# Altium integrated library WE_WR-MPC4_Mini Power Connector_4.20 mm_rev15b.IntLib: 79 symbols (continued)
## WE-4.20 mm Male Dual Row Vertical Header 64902421122 (continued)
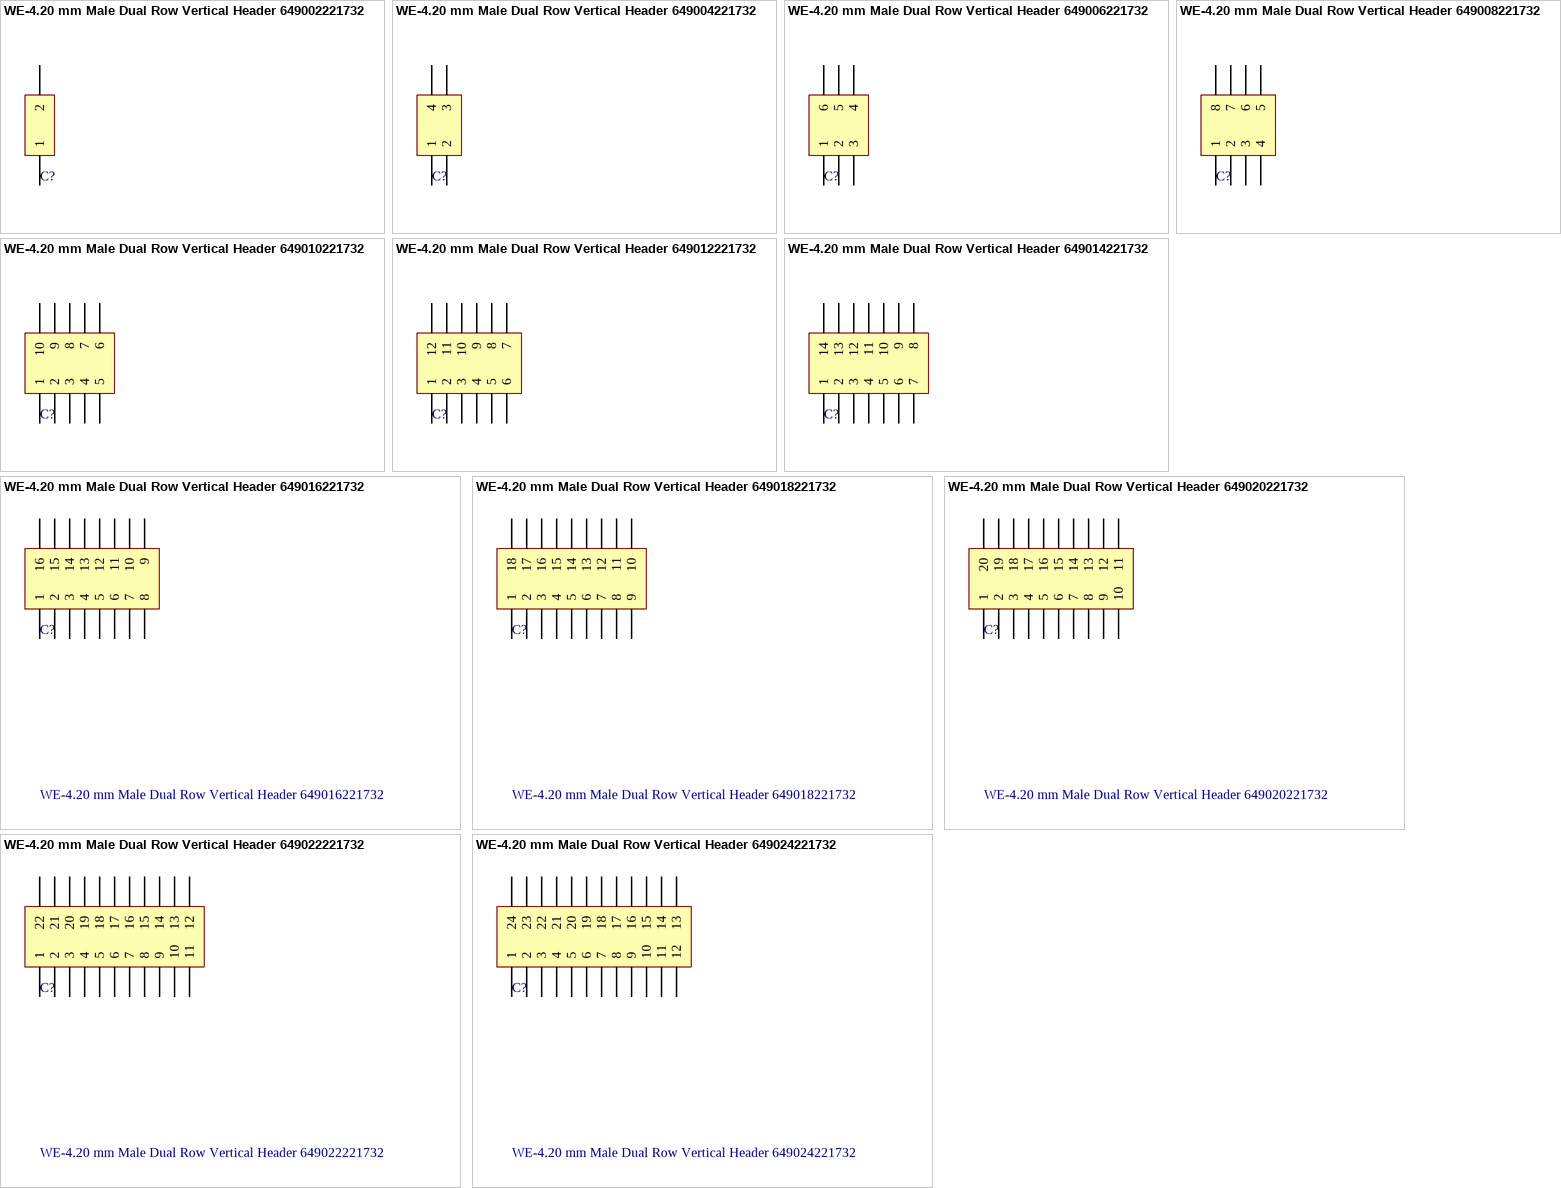
[diagram p3: symbols WE-4.20 mm Male Dual Row Vertical Header 649002221732 to WE-4.20 mm Male Dual Row Vertical Header 649024221732]

## WE-4.20 mm Male Dual Row Vertical Header 649002221732
designator C?
WR-MPC4 Mini power connector; Manufacturer: Würth Elektronik eiSos GmbH; ComponentLink1 Description: Manufacturer; ComponentLink2 Description: Datasheet; NoPins: 2; Created Date: 24 June 2013; partNo: 649002221732; ComponentLink1URL: http://www.we-online.com; ComponentLink2URL: http://katalog.we-online.de/em/datasheet/6490xx221732.pdf; Created by: Karrer Zheng
footprint 649002221732 (Dual row Vertical header With mounting pegs 02p)
pins: 1, 2

## WE-4.20 mm Male Dual Row Vertical Header 649004221732
designator C?
WR-MPC4 Mini power connector; Manufacturer: Würth Elektronik eiSos GmbH; ComponentLink1 Description: Manufacturer; ComponentLink2 Description: Datasheet; NoPins: 4; Created Date: 24 June 2013; partNo: 649004221732; ComponentLink1URL: http://www.we-online.com; ComponentLink2URL: http://katalog.we-online.de/em/datasheet/6490xx221732.pdf; Created by: Karrer Zheng
footprint 649004221732 (Dual row Vertical header With mounting pegs 04p)
pins: 1, 2, 3, 4

## WE-4.20 mm Male Dual Row Vertical Header 649006221732
designator C?
WR-MPC4 Mini power connector; Manufacturer: Würth Elektronik eiSos GmbH; ComponentLink1 Description: Manufacturer; ComponentLink2 Description: Datasheet; NoPins: 6; Created Date: 24 June 2013; partNo: 649006221732; ComponentLink1URL: http://www.we-online.com; ComponentLink2URL: http://katalog.we-online.de/em/datasheet/6490xx221732.pdf; Created by: Karrer Zheng
footprint 649006221732 (Dual row Vertical header With mounting pegs 06p)
pins: 1, 2, 3, 4, 5, 6

## WE-4.20 mm Male Dual Row Vertical Header 649008221732
designator C?
WR-MPC4 Mini power connector; Manufacturer: Würth Elektronik eiSos GmbH; ComponentLink1 Description: Manufacturer; ComponentLink2 Description: Datasheet; NoPins: 08; Created Date: 24 June 2013; partNo: 649008221732; ComponentLink1URL: http://www.we-online.com; ComponentLink2URL: http://katalog.we-online.de/em/datasheet/6490xx221732.pdf; Created by: Karrer Zheng
footprint 649008221732 (Dual row Vertical header With mounting pegs 08p)
pins: 1, 2, 3, 4, 5, 6, 7, 8

## WE-4.20 mm Male Dual Row Vertical Header 649010221732
designator C?
WR-MPC4 Mini power connector; Manufacturer: Würth Elektronik eiSos GmbH; ComponentLink1 Description: Manufacturer; ComponentLink2 Description: Datasheet; NoPins: 10; Created Date: 24 June 2013; partNo: 649010221732; ComponentLink1URL: http://www.we-online.com; ComponentLink2URL: http://katalog.we-online.de/em/datasheet/6490xx221732.pdf; Created by: Karrer Zheng
footprint 649010221732 (Dual row Vertical header With mounting pegs 10p)
pins: 1, 2, 3, 4, 5, 6, 7, 8, 9, 10

## WE-4.20 mm Male Dual Row Vertical Header 649012221732
designator C?
WR-MPC4 Mini power connector; Manufacturer: Würth Elektronik eiSos GmbH; ComponentLink1 Description: Manufacturer; ComponentLink2 Description: Datasheet; NoPins: 12; Created Date: 24 June 2013; partNo: 649012221732; ComponentLink1URL: http://www.we-online.com; ComponentLink2URL: http://katalog.we-online.de/em/datasheet/6490xx221732.pdf; Created by: Karrer Zheng
footprint 649012221732 (Dual row Vertical header With mounting pegs 12p)
pins: 1, 2, 3, 4, 5, 6, 7, 8, 9, 10, 11, 12

## WE-4.20 mm Male Dual Row Vertical Header 649014221732
designator C?
WR-MPC4 Mini power connector; Manufacturer: Würth Elektronik eiSos GmbH; ComponentLink1 Description: Manufacturer; ComponentLink2 Description: Datasheet; NoPins: 14; Created Date: 24 June 2013; partNo: 649014221732; ComponentLink1URL: http://www.we-online.com; ComponentLink2URL: http://katalog.we-online.de/em/datasheet/6490xx221732.pdf; Created by: Karrer Zheng
footprint 649014221732 (Dual row Vertical header With mounting pegs 14p)
pins: 1, 2, 3, 4, 5, 6, 7, 8, 9, 10, 11, 12, 13, 14

## WE-4.20 mm Male Dual Row Vertical Header 649016221732
designator C?
WR-MPC4 Mini power connector; Manufacturer: Würth Elektronik eiSos GmbH; ComponentLink1 Description: Manufacturer; ComponentLink2 Description: Datasheet; NoPins: 16; Created Date: 24 June 2013; partNo: 649016221732; ComponentLink1URL: http://www.we-online.com; ComponentLink2URL: http://katalog.we-online.de/em/datasheet/6490xx221732.pdf; Created by: Karrer Zheng
footprint 649016221732 (Dual row Vertical header With mounting pegs 16p)
pins: 1, 2, 3, 4, 5, 6, 7, 8, 9, 10, 11, 12, 13, 14, 15, 16

## WE-4.20 mm Male Dual Row Vertical Header 649018221732
designator C?
WR-MPC4 Mini power connector; Manufacturer: Würth Elektronik eiSos GmbH; ComponentLink1 Description: Manufacturer; ComponentLink2 Description: Datasheet; NoPins: 18; Created Date: 24 June 2013; partNo: 649018221732; ComponentLink1URL: http://www.we-online.com; ComponentLink2URL: http://katalog.we-online.de/em/datasheet/6490xx221732.pdf; Created by: Karrer Zheng
footprint 649018221732 (Dual row Vertical header With mounting pegs 18p)
pins: 1, 2, 3, 4, 5, 6, 7, 8, 9, 10, 11, 12, 13, 14, 15, 16, 17, 18

## WE-4.20 mm Male Dual Row Vertical Header 649020221732
designator C?
WR-MPC4 Mini power connector; Manufacturer: Würth Elektronik eiSos GmbH; ComponentLink1 Description: Manufacturer; ComponentLink2 Description: Datasheet; NoPins: 20; Created Date: 24 June 2013; partNo: 649020221732; ComponentLink1URL: http://www.we-online.com; ComponentLink2URL: http://katalog.we-online.de/em/datasheet/6490xx221732.pdf; Created by: Karrer Zheng
footprint 649020221732 (Dual row Vertical header With mounting pegs 20p)
pins: 1, 2, 3, 4, 5, 6, 7, 8, 9, 10, 11, 12, 13, 14, 15, 16, 17, 18, 19, 20

## WE-4.20 mm Male Dual Row Vertical Header 649022221732
designator C?
WR-MPC4 Mini power connector; Manufacturer: Würth Elektronik eiSos GmbH; ComponentLink1 Description: Manufacturer; ComponentLink2 Description: Datasheet; NoPins: 22; Created Date: 24 June 2013; partNo: 649022221732; ComponentLink1URL: http://www.we-online.com; ComponentLink2URL: http://katalog.we-online.de/em/datasheet/6490xx221732.pdf; Created by: Karrer Zheng
footprint 649022221732 (Dual row Vertical header With mounting pegs 22p)
pins: 1, 2, 3, 4, 5, 6, 7, 8, 9, 10, 11, 12, 13, 14, 15, 16, 17, 18, 19, 20, 21, 22

## WE-4.20 mm Male Dual Row Vertical Header 649024221732
designator C?
WR-MPC4 Mini power connector; Manufacturer: Würth Elektronik eiSos GmbH; ComponentLink1 Description: Manufacturer; ComponentLink2 Description: Datasheet; NoPins: 24; Created Date: 24 June 2013; partNo: 649024221732; ComponentLink1URL: http://www.we-online.com; ComponentLink2URL: http://katalog.we-online.de/em/datasheet/6490xx221732.pdf; Created by: Karrer Zheng
footprint 649024221732 (Dual row Vertical header With mounting pegs 24p)
pins: 1, 2, 3, 4, 5, 6, 7, 8, 9, 10, 11, 12, 13, 14, 15, 16, 17, 18, 19, 20, 21, 22, 23, 24


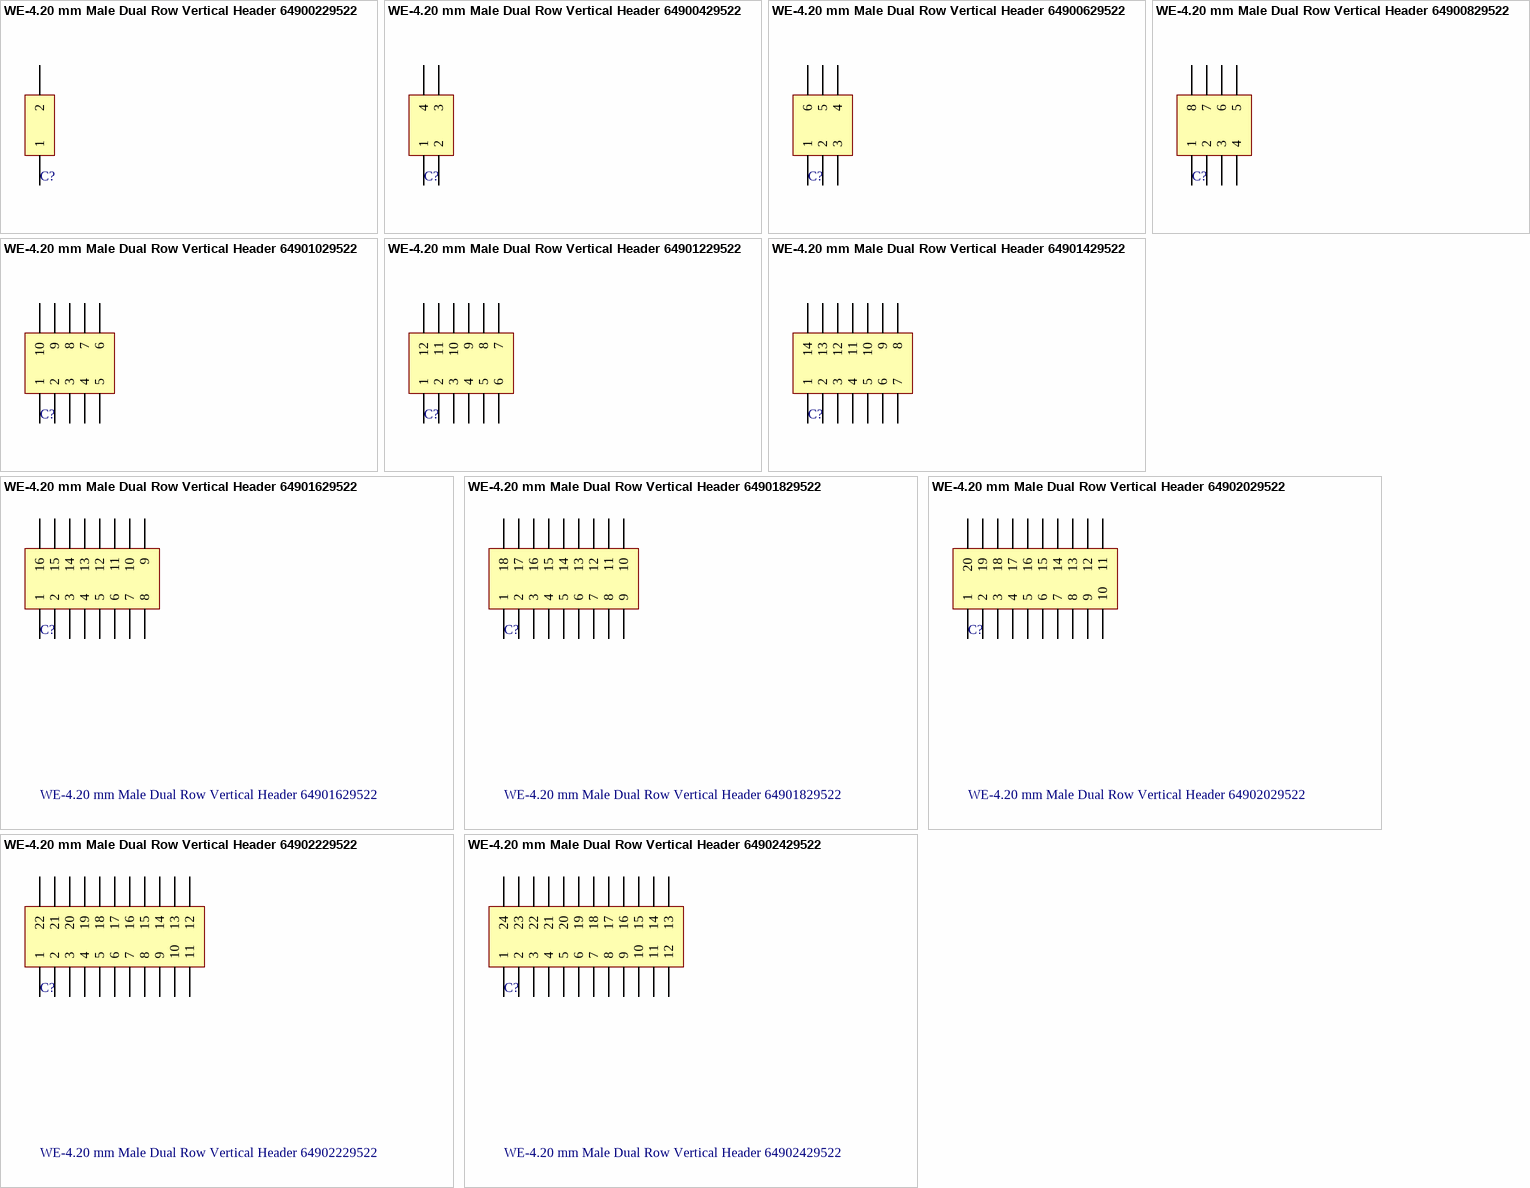
[diagram p4: symbols WE-4.20 mm Male Dual Row Vertical Header 64900229522 to WE-4.20 mm Male Dual Row Vertical Header 64902429522]

## WE-4.20 mm Male Dual Row Vertical Header 64900229522
designator C?
WR-MPC4 Mini power connector; Manufacturer: Würth Elektronik eiSos GmbH; ComponentLink1 Description: Manufacturer; ComponentLink2 Description: Datasheet; NoPins: 2; Created Date: 3 July 2013; partNo: 64900229522; ComponentLink1URL: http://www.we-online.com; ComponentLink2URL: http://katalog.we-online.de/em/datasheet/6490xx29522.pdf; Created by: Karrer Zheng
footprint 64900229522 (Dual row Right angle header 02p)
pins: 1, 2

## WE-4.20 mm Male Dual Row Vertical Header 64900429522
designator C?
WR-MPC4 Mini power connector; Manufacturer: Würth Elektronik eiSos GmbH; ComponentLink1 Description: Manufacturer; ComponentLink2 Description: Datasheet; NoPins: 4; Created Date: 3 July 2013; partNo: 64900429522; ComponentLink1URL: http://www.we-online.com; ComponentLink2URL: http://katalog.we-online.de/em/datasheet/6490xx29522.pdf; Created by: Karrer Zheng
footprint 64900429522 (Dual row Right angle header 04p)
pins: 1, 2, 3, 4

## WE-4.20 mm Male Dual Row Vertical Header 64900629522
designator C?
WR-MPC4 Mini power connector; Manufacturer: Würth Elektronik eiSos GmbH; ComponentLink1 Description: Manufacturer; ComponentLink2 Description: Datasheet; NoPins: 6; Created Date: 3 July 2013; partNo: 64900629522; ComponentLink1URL: http://www.we-online.com; ComponentLink2URL: http://katalog.we-online.de/em/datasheet/6490xx29522.pdf; Created by: Karrer Zheng
footprint 64900629522 (Dual row Right angle header 06p)
pins: 1, 2, 3, 4, 5, 6

## WE-4.20 mm Male Dual Row Vertical Header 64900829522
designator C?
WR-MPC4 Mini power connector; Manufacturer: Würth Elektronik eiSos GmbH; ComponentLink1 Description: Manufacturer; ComponentLink2 Description: Datasheet; NoPins: 8; Created Date: 3 July 2013; partNo: 64900829522; ComponentLink1URL: http://www.we-online.com; ComponentLink2URL: http://katalog.we-online.de/em/datasheet/6490xx29522.pdf; Created by: Karrer Zheng
footprint 64900829522 (Dual row Right angle header 08p)
pins: 1, 2, 3, 4, 5, 6, 7, 8

## WE-4.20 mm Male Dual Row Vertical Header 64901029522
designator C?
WR-MPC4 Mini power connector; Manufacturer: Würth Elektronik eiSos GmbH; ComponentLink1 Description: Manufacturer; ComponentLink2 Description: Datasheet; NoPins: 10; Created Date: 3 July 2013; partNo: 64901029522; ComponentLink1URL: http://www.we-online.com; ComponentLink2URL: http://katalog.we-online.de/em/datasheet/6490xx29522.pdf; Created by: Karrer Zheng
footprint 64901029522 (Dual row Right angle header 10p)
pins: 1, 2, 3, 4, 5, 6, 7, 8, 9, 10

## WE-4.20 mm Male Dual Row Vertical Header 64901229522
designator C?
WR-MPC4 Mini power connector; Manufacturer: Würth Elektronik eiSos GmbH; ComponentLink1 Description: Manufacturer; ComponentLink2 Description: Datasheet; NoPins: 12; Created Date: 3 July 2013; partNo: 64901229522; ComponentLink1URL: http://www.we-online.com; ComponentLink2URL: http://katalog.we-online.de/em/datasheet/6490xx29522.pdf; Created by: Karrer Zheng
footprint 64901229522 (Dual row Right angle header 12p)
pins: 1, 2, 3, 4, 5, 6, 7, 8, 9, 10, 11, 12

## WE-4.20 mm Male Dual Row Vertical Header 64901429522
designator C?
WR-MPC4 Mini power connector; Manufacturer: Würth Elektronik eiSos GmbH; ComponentLink1 Description: Manufacturer; ComponentLink2 Description: Datasheet; NoPins: 14; Created Date: 3 July 2013; partNo: 64901429522; ComponentLink1URL: http://www.we-online.com; ComponentLink2URL: http://katalog.we-online.de/em/datasheet/6490xx29522.pdf; Created by: Karrer Zheng
footprint 64901429522 (Dual row Right angle header 14p)
pins: 1, 2, 3, 4, 5, 6, 7, 8, 9, 10, 11, 12, 13, 14

## WE-4.20 mm Male Dual Row Vertical Header 64901629522
designator C?
WR-MPC4 Mini power connector; Manufacturer: Würth Elektronik eiSos GmbH; ComponentLink1 Description: Manufacturer; ComponentLink2 Description: Datasheet; NoPins: 16; Created Date: 3 July 2013; partNo: 64901629522; ComponentLink1URL: http://www.we-online.com; ComponentLink2URL: http://katalog.we-online.de/em/datasheet/6490xx29522.pdf; Created by: Karrer Zheng
footprint 64901629522 (Dual row Right angle header 16p)
pins: 1, 2, 3, 4, 5, 6, 7, 8, 9, 10, 11, 12, 13, 14, 15, 16

## WE-4.20 mm Male Dual Row Vertical Header 64901829522
designator C?
WR-MPC4 Mini power connector; Manufacturer: Würth Elektronik eiSos GmbH; ComponentLink1 Description: Manufacturer; ComponentLink2 Description: Datasheet; NoPins: 18; Created Date: 3 July 2013; partNo: 64901829522; ComponentLink1URL: http://www.we-online.com; ComponentLink2URL: http://katalog.we-online.de/em/datasheet/6490xx29522.pdf; Created by: Karrer Zheng
footprint 64901829522 (Dual row Right angle header 18p)
pins: 1, 2, 3, 4, 5, 6, 7, 8, 9, 10, 11, 12, 13, 14, 15, 16, 17, 18

## WE-4.20 mm Male Dual Row Vertical Header 64902029522
designator C?
WR-MPC4 Mini power connector; Manufacturer: Würth Elektronik eiSos GmbH; ComponentLink1 Description: Manufacturer; ComponentLink2 Description: Datasheet; NoPins: 20; Created Date: 3 July 2013; partNo: 64902029522; ComponentLink1URL: http://www.we-online.com; ComponentLink2URL: http://katalog.we-online.de/em/datasheet/6490xx29522.pdf; Created by: Karrer Zheng
footprint 64902029522 (Dual row Right angle header 20p)
pins: 1, 2, 3, 4, 5, 6, 7, 8, 9, 10, 11, 12, 13, 14, 15, 16, 17, 18, 19, 20

## WE-4.20 mm Male Dual Row Vertical Header 64902229522
designator C?
WR-MPC4 Mini power connector; Manufacturer: Würth Elektronik eiSos GmbH; ComponentLink1 Description: Manufacturer; ComponentLink2 Description: Datasheet; NoPins: 22; Created Date: 3 July 2013; partNo: 64902229522; ComponentLink1URL: http://www.we-online.com; ComponentLink2URL: http://katalog.we-online.de/em/datasheet/6490xx29522.pdf; Created by: Karrer Zheng
footprint 64902229522 (Dual row Right angle header 22p)
pins: 1, 2, 3, 4, 5, 6, 7, 8, 9, 10, 11, 12, 13, 14, 15, 16, 17, 18, 19, 20, 21, 22

## WE-4.20 mm Male Dual Row Vertical Header 64902429522
designator C?
WR-MPC4 Mini power connector; Manufacturer: Würth Elektronik eiSos GmbH; ComponentLink1 Description: Manufacturer; ComponentLink2 Description: Datasheet; NoPins: 24; Created Date: 3 July 2013; partNo: 64902429522; ComponentLink1URL: http://www.we-online.com; ComponentLink2URL: http://katalog.we-online.de/em/datasheet/6490xx29522.pdf; Created by: Karrer Zheng
footprint 64902429522 (Dual row Right angle header 24p)
pins: 1, 2, 3, 4, 5, 6, 7, 8, 9, 10, 11, 12, 13, 14, 15, 16, 17, 18, 19, 20, 21, 22, 23, 24


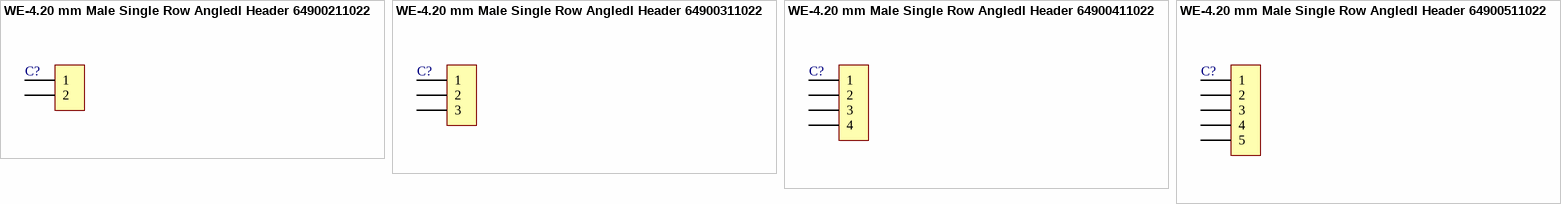
[diagram p5: symbols WE-4.20 mm Male Single Row Angledl Header 64900211022 to WE-4.20 mm Male Single Row Angledl Header 64900511022]

## WE-4.20 mm Male Single Row Angledl Header 64900211022
designator C?
WR-MPC4 Mini power connector; Manufacturer: Würth Elektronik eiSos GmbH; ComponentLink1 Description: Manufacturer; ComponentLink2 Description: Datasheet; NoPins: 02; Created Date: 12 August 2013; partNo: 64900211022; ComponentLink1URL: http://www.we-online.com; ComponentLink2URL: http://katalog.we-online.de/em/datasheet/6490xx11022.pdf; Created by: Karrer Zheng
footprint 64900211022 (Single row Right angle header With mounting flanges 02p)
pins: 1, 2

## WE-4.20 mm Male Single Row Angledl Header 64900311022
designator C?
WR-MPC4 Mini power connector; Manufacturer: Würth Elektronik eiSos GmbH; ComponentLink1 Description: Manufacturer; ComponentLink2 Description: Datasheet; NoPins: 03; Created Date: 12 August 2013; partNo: 64900311022; ComponentLink1URL: http://www.we-online.com; ComponentLink2URL: http://katalog.we-online.de/em/datasheet/6490xx11022.pdf; Created by: Karrer Zheng
footprint 64900311022 (Single row Right angle header With mounting flanges 03p)
pins: 1, 2, 3

## WE-4.20 mm Male Single Row Angledl Header 64900411022
designator C?
WR-MPC4 Mini power connector; Manufacturer: Würth Elektronik eiSos GmbH; ComponentLink1 Description: Manufacturer; ComponentLink2 Description: Datasheet; NoPins: 04; Created Date: 12 August 2013; partNo: 64900411022; ComponentLink1URL: http://www.we-online.com; ComponentLink2URL: http://katalog.we-online.de/em/datasheet/6490xx11022.pdf; Created by: Karrer Zheng
footprint 64900411022 (Single row Right angle header With mounting flanges 04p)
pins: 1, 2, 3, 4

## WE-4.20 mm Male Single Row Angledl Header 64900511022
designator C?
WR-MPC4 Mini power connector; Manufacturer: Würth Elektronik eiSos GmbH; ComponentLink1 Description: Manufacturer; ComponentLink2 Description: Datasheet; NoPins: 05; Created Date: 12 August 2013; partNo: 64900511022; ComponentLink1URL: http://www.we-online.com; ComponentLink2URL: http://katalog.we-online.de/em/datasheet/6490xx11022.pdf; Created by: Karrer Zheng
footprint 64900511022 (Single row Right angle header With mounting flanges 05p)
pins: 1, 2, 3, 4, 5


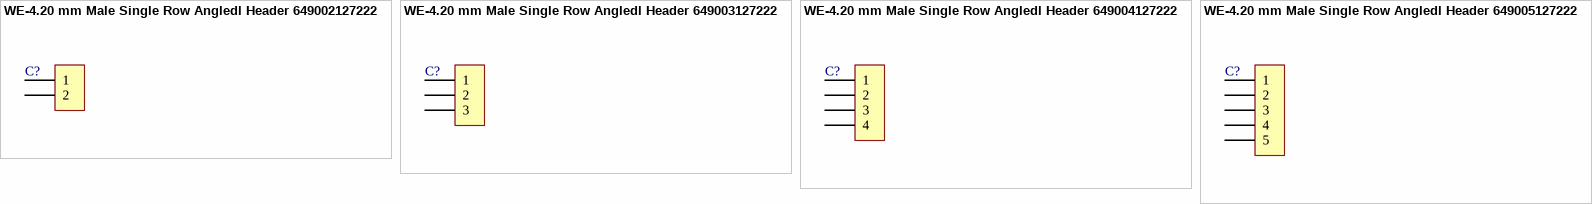
[diagram p6: symbols WE-4.20 mm Male Single Row Angledl Header 649002127222 to WE-4.20 mm Male Single Row Angledl Header 649005127222]

## WE-4.20 mm Male Single Row Angledl Header 649002127222
designator C?
WR-MPC4 Mini power connector; Manufacturer: Würth Elektronik eiSos GmbH; ComponentLink1 Description: Manufacturer; ComponentLink2 Description: Datasheet; NoPins: 02; Created Date: 12 August 2013; partNo: 649002127222; ComponentLink1URL: http://www.we-online.com; ComponentLink2URL: http://katalog.we-online.de/em/datasheet/6490xx127222.pdf; Created by: Karrer Zheng
footprint 649002127222 (Single row Right angle header With mounting pegs 02p)
pins: 1, 2

## WE-4.20 mm Male Single Row Angledl Header 649003127222
designator C?
WR-MPC4 Mini power connector; Manufacturer: Würth Elektronik eiSos GmbH; ComponentLink1 Description: Manufacturer; ComponentLink2 Description: Datasheet; NoPins: 03; Created Date: 12 August 2013; partNo: 649003127222; ComponentLink1URL: http://www.we-online.com; ComponentLink2URL: http://katalog.we-online.de/em/datasheet/6490xx127222.pdf; Created by: Karrer Zheng
footprint 649003127222 (Single row Right angle header With mounting pegs 03p)
pins: 1, 2, 3

## WE-4.20 mm Male Single Row Angledl Header 649004127222
designator C?
WR-MPC4 Mini power connector; Manufacturer: Würth Elektronik eiSos GmbH; ComponentLink1 Description: Manufacturer; ComponentLink2 Description: Datasheet; NoPins: 04; Created Date: 12 August 2013; partNo: 649004127222; ComponentLink1URL: http://www.we-online.com; ComponentLink2URL: http://katalog.we-online.de/em/datasheet/6490xx127222.pdf; Created by: Karrer Zheng
footprint 649004127222 (Single row Right angle header With mounting pegs 04p)
pins: 1, 2, 3, 4

## WE-4.20 mm Male Single Row Angledl Header 649005127222
designator C?
WR-MPC4 Mini power connector; Manufacturer: Würth Elektronik eiSos GmbH; ComponentLink1 Description: Manufacturer; ComponentLink2 Description: Datasheet; NoPins: 05; Created Date: 12 August 2013; partNo: 649005127222; ComponentLink1URL: http://www.we-online.com; ComponentLink2URL: http://katalog.we-online.de/em/datasheet/6490xx127222.pdf; Created by: Karrer Zheng
footprint 649005127222 (Single row Right angle header With mounting pegs 05p)
pins: 1, 2, 3, 4, 5


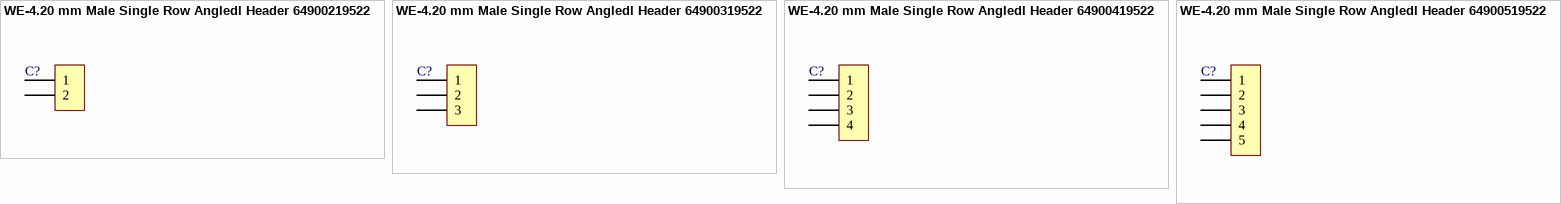
[diagram p7: symbols WE-4.20 mm Male Single Row Angledl Header 64900219522 to WE-4.20 mm Male Single Row Angledl Header 64900519522]

## WE-4.20 mm Male Single Row Angledl Header 64900219522
designator C?
WR-MPC4 Mini power connector; Manufacturer: Würth Elektronik eiSos GmbH; ComponentLink1 Description: Manufacturer; ComponentLink2 Description: Datasheet; NoPins: 02; Created Date: 8 August 2013; partNo: 64900219522; ComponentLink1URL: http://www.we-online.com; ComponentLink2URL: http://katalog.we-online.de/em/datasheet/6490xx19522.pdf; Created by: Karrer Zheng
footprint 64900219522 (Single row Right angle header 02p)
pins: 1, 2

## WE-4.20 mm Male Single Row Angledl Header 64900319522
designator C?
WR-MPC4 Mini power connector; Manufacturer: Würth Elektronik eiSos GmbH; ComponentLink1 Description: Manufacturer; ComponentLink2 Description: Datasheet; NoPins: 03; Created Date: 8 August 2013; partNo: 64900319522; ComponentLink1URL: http://www.we-online.com; ComponentLink2URL: http://katalog.we-online.de/em/datasheet/6490xx19522.pdf; Created by: Karrer Zheng
footprint 64900319522 (Single row Right angle header 03p)
pins: 1, 2, 3

## WE-4.20 mm Male Single Row Angledl Header 64900419522
designator C?
WR-MPC4 Mini power connector; Manufacturer: Würth Elektronik eiSos GmbH; ComponentLink1 Description: Manufacturer; ComponentLink2 Description: Datasheet; NoPins: 04; Created Date: 8 August 2013; partNo: 64900419522; ComponentLink1URL: http://www.we-online.com; ComponentLink2URL: http://katalog.we-online.de/em/datasheet/6490xx19522.pdf; Created by: Karrer Zheng
footprint 64900419522 (Single row Right angle header 04p)
pins: 1, 2, 3, 4

## WE-4.20 mm Male Single Row Angledl Header 64900519522
designator C?
WR-MPC4 Mini power connector; Manufacturer: Würth Elektronik eiSos GmbH; ComponentLink1 Description: Manufacturer; ComponentLink2 Description: Datasheet; NoPins: 05; Created Date: 8 August 2013; partNo: 64900519522; ComponentLink1URL: http://www.we-online.com; ComponentLink2URL: http://katalog.we-online.de/em/datasheet/6490xx19522.pdf; Created by: Karrer Zheng
footprint 64900519522 (Single row Right angle header 05p)
pins: 1, 2, 3, 4, 5


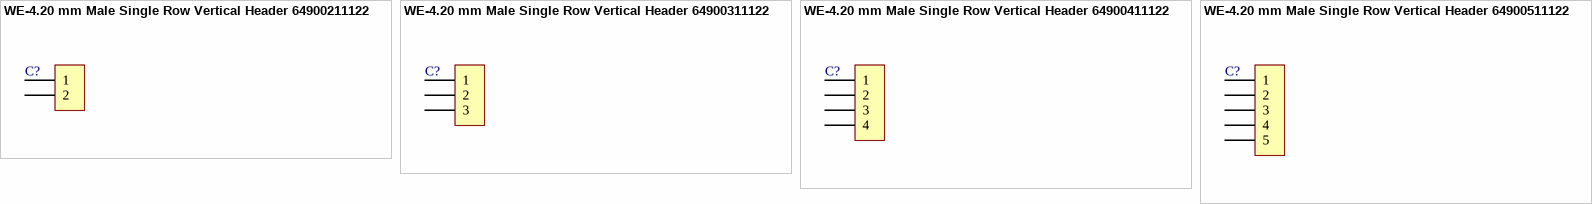
[diagram p8: symbols WE-4.20 mm Male Single Row Vertical Header 64900211122 to WE-4.20 mm Male Single Row Vertical Header 64900511122]

## WE-4.20 mm Male Single Row Vertical Header 64900211122
designator C?
WR-MPC4 Mini power connector; Manufacturer: Würth Elektronik eiSos GmbH; ComponentLink1 Description: Manufacturer; ComponentLink2 Description: Datasheet; NoPins: 02; Created Date: 8 August 2013; partNo: 64900211122; ComponentLink1URL: http://www.we-online.com; ComponentLink2URL: http://katalog.we-online.de/em/datasheet/6490xx11122.pdf; Created by: Karrer Zheng
footprint 64900211122 (Single row Vertical header 02p)
pins: 1, 2

## WE-4.20 mm Male Single Row Vertical Header 64900311122
designator C?
WR-MPC4 Mini power connector; Manufacturer: Würth Elektronik eiSos GmbH; ComponentLink1 Description: Manufacturer; ComponentLink2 Description: Datasheet; NoPins: 03; Created Date: 8 August 2013; partNo: 64900311122; ComponentLink1URL: http://www.we-online.com; ComponentLink2URL: http://katalog.we-online.de/em/datasheet/6490xx11122.pdf; Created by: Karrer Zheng
footprint 64900311122 (Single row Vertical header 03p)
pins: 1, 2, 3

## WE-4.20 mm Male Single Row Vertical Header 64900411122
designator C?
WR-MPC4 Mini power connector; Manufacturer: Würth Elektronik eiSos GmbH; ComponentLink1 Description: Manufacturer; ComponentLink2 Description: Datasheet; NoPins: 04; Created Date: 8 August 2013; partNo: 64900411122; ComponentLink1URL: http://www.we-online.com; ComponentLink2URL: http://katalog.we-online.de/em/datasheet/6490xx11122.pdf; Created by: Karrer Zheng
footprint 64900411122 (Single row Vertical header 04p)
pins: 1, 2, 3, 4

## WE-4.20 mm Male Single Row Vertical Header 64900511122
designator C?
WR-MPC4 Mini power connector; Manufacturer: Würth Elektronik eiSos GmbH; ComponentLink1 Description: Manufacturer; ComponentLink2 Description: Datasheet; NoPins: 05; Created Date: 8 August 2013; partNo: 64900511122; ComponentLink1URL: http://www.we-online.com; ComponentLink2URL: http://katalog.we-online.de/em/datasheet/6490xx11122.pdf; Created by: Karrer Zheng
footprint 64900511122 (Single row Vertical header 05p)
pins: 1, 2, 3, 4, 5


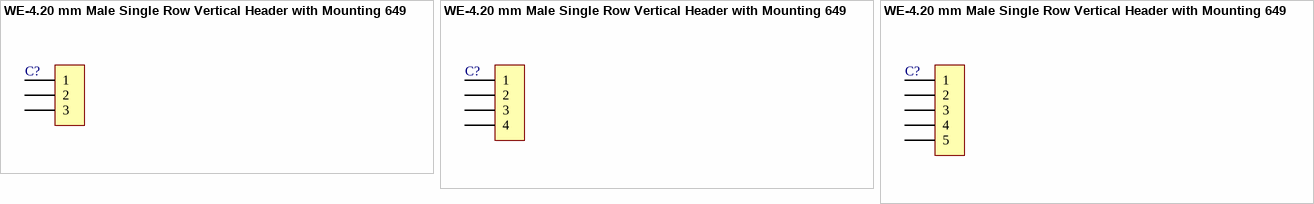
[diagram p9: symbols WE-4.20 mm Male Single Row Vertical Header with Mounting 649003121732 to WE-4.20 mm Male Single Row Vertical Header with Mounting 649005121732]

## WE-4.20 mm Male Single Row Vertical Header with Mounting 649003121732
designator C?
WR-MPC4 Mini power connector; Manufacturer: Würth Elektronik eiSos GmbH; ComponentLink1 Description: Manufacturer; ComponentLink2 Description: Datasheet; NoPins: 03; Created Date: 8 August 2013; partNo: 649003121732; ComponentLink1URL: http://www.we-online.com; ComponentLink2URL: http://katalog.we-online.de/em/datasheet/6490xx121732.pdf; Created by: Karrer Zheng
footprint 649003121732 (Single row Straight header With mounting pegs 03p)
pins: 1, 2, 3

## WE-4.20 mm Male Single Row Vertical Header with Mounting 649004121732
designator C?
WR-MPC4 Mini power connector; Manufacturer: Würth Elektronik eiSos GmbH; ComponentLink1 Description: Manufacturer; ComponentLink2 Description: Datasheet; NoPins: 04; Created Date: 8 August 2013; partNo: 649004121732; ComponentLink1URL: http://www.we-online.com; ComponentLink2URL: http://katalog.we-online.de/em/datasheet/6490xx121732.pdf; Created by: Karrer Zheng
footprint 649004121732 (Single row Straight header With mounting pegs 04p)
pins: 1, 2, 3, 4

## WE-4.20 mm Male Single Row Vertical Header with Mounting 649005121732
designator C?
WR-MPC4 Mini power connector; Manufacturer: Würth Elektronik eiSos GmbH; ComponentLink1 Description: Manufacturer; ComponentLink2 Description: Datasheet; NoPins: 05; Created Date: 8 August 2013; partNo: 649005121732; ComponentLink1URL: http://www.we-online.com; ComponentLink2URL: http://katalog.we-online.de/em/datasheet/6490xx121732.pdf; Created by: Karrer Zheng
footprint 649005121732 (Single row Straight header With mounting pegs 05p)
pins: 1, 2, 3, 4, 5